# Altium footprint library WR-FPC_1.00mm.PcbLib: 105 footprints (part 6 of 7)
Each footprint in its own frame and in the unit in brackets; x right, y up, seen from the top. Pads: shape width x height; smd on the part's side, far side on the other; paste and mask are expansions set on the pad; w line width, h text height; cw(c..) or ccw(c..) is an arc to the next point about the centre after c.
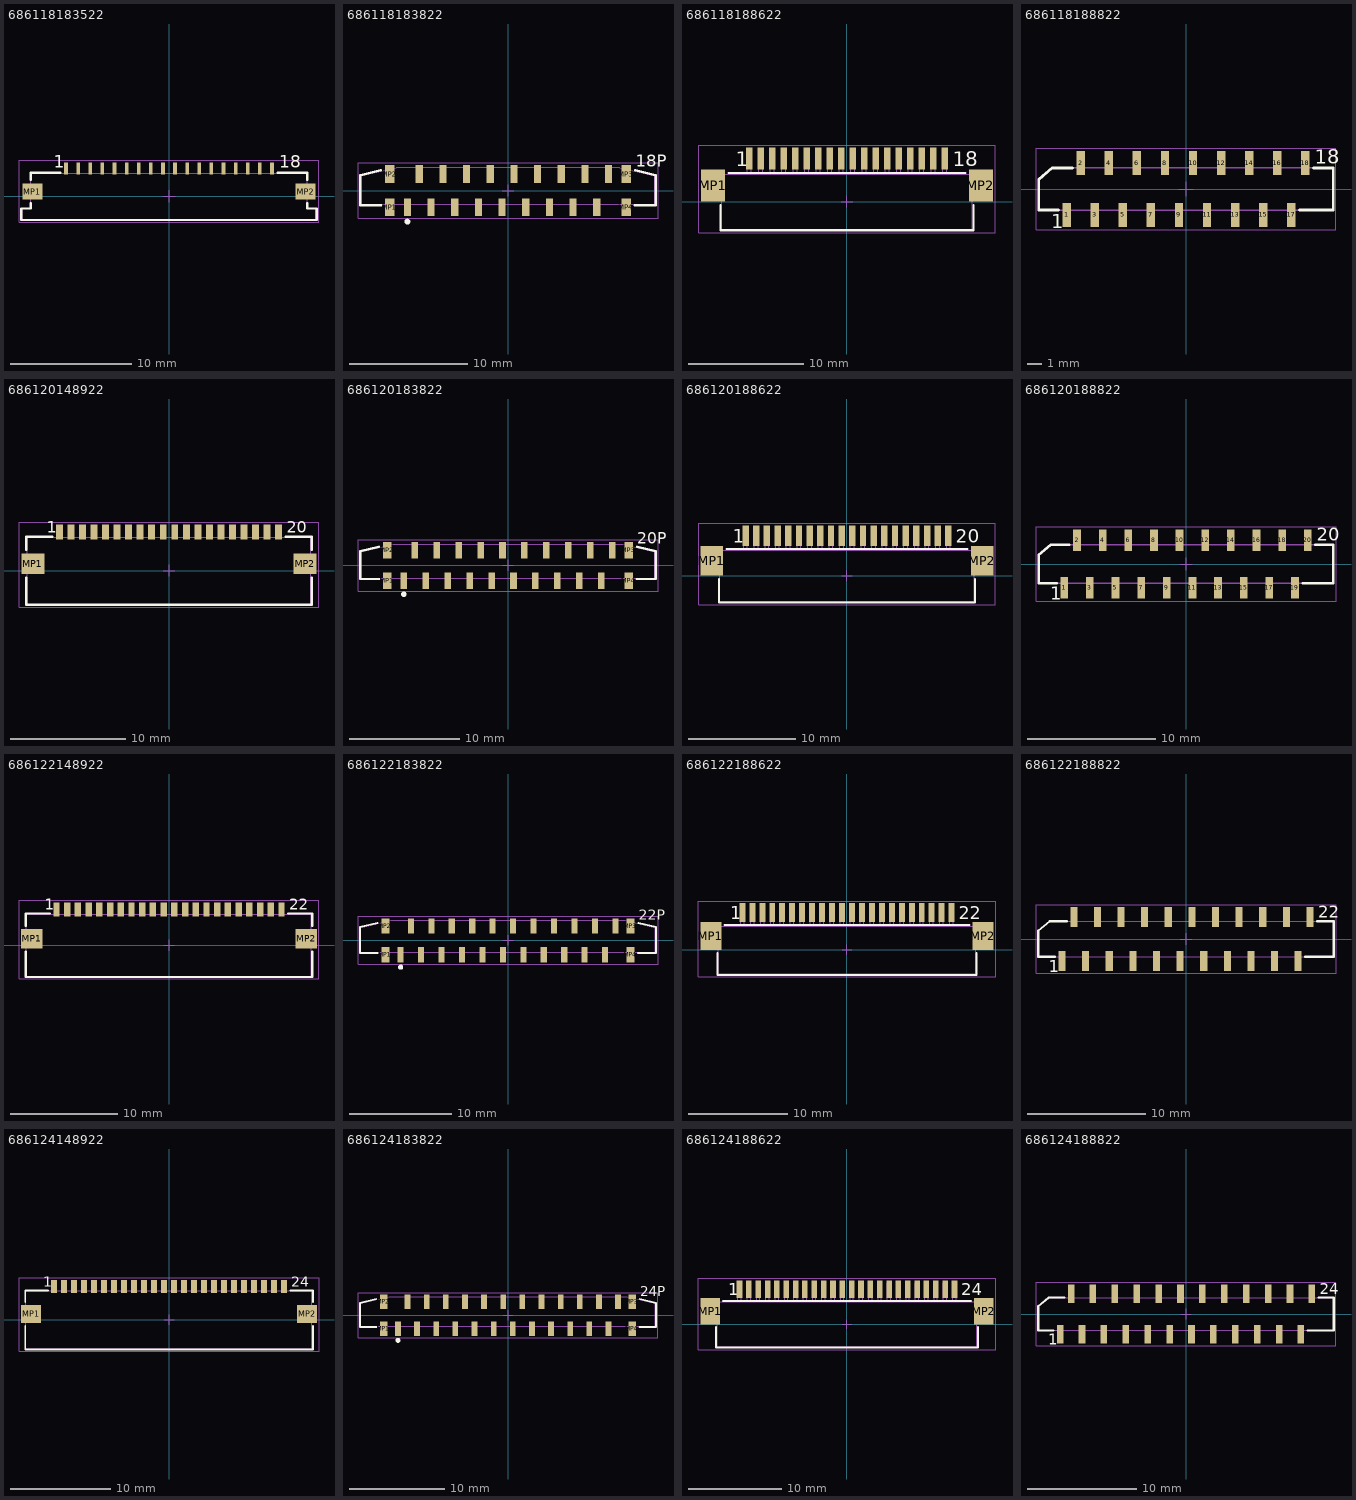
[diagram p5: the footprints below, top view; thin cyan lines are the x and y axes]

## 686118183522 [mm] "ZIF Connectors, Horizontal, Bottom Contact Low Profile, pitch 1mm, 18p"
height 1.3
pads (20):
  rect 0.3x1 smd: 1(-8.5,2.3) 2(-7.5,2.3) 3(-6.5,2.3) 4(-5.5,2.3) 5(-4.5,2.3) 6(-3.5,2.3) 7(-2.5,2.3) 8(-1.5,2.3) 9(-0.5,2.3) 10(0.5,2.3) 11(1.5,2.3) 12(2.5,2.3) 13(3.5,2.3) 14(4.5,2.3) 15(5.5,2.3) 16(6.5,2.3) 17(7.5,2.3) 18(8.5,2.3)
  rect 1.65x1.3 smd: MP1(-11.275,0.4) MP2(11.275,0.4)
Top Overlay:
  lines w0.2: -11.4,-0.55 -11.4,-1 -12.175,-1 -12.175,-1.95 12.175,-1.95 12.175,-1 11.4,-1 11.4,-0.55 ; -11.4,1.35 -11.4,1.95 -8.95,1.95 ; 8.95,1.95 11.4,1.95 11.4,1.35
  text "18" at 9.1,2.35 h1.02
  text "1" at -9.5,2.35 h1.02
Mechanical 13:
  lines w0.1: -12.1,-1 -11.4,-1 -11.4,1.9 11.4,1.9 11.4,-1 12.1,-1 12.1,-1.9 -12.1,-1.9 -12.1,-1 ; -12.1,-1 -12.1,-1
Mechanical 15:
  lines w0.05: -0.5,0 0.5,0 ; 0,-0.5 0,0.5 ; -12.375,-2.15 12.375,-2.15 12.375,3 -12.375,3 -12.375,-2.15
3D body "686118183522.stp": height 1.24, standoff -0.01, extent -12.1,-1.9 12.1,2.35

## 686118183822 [mm] "ZIF Connectors, Vertical, Type A, pitch 1mm, 18p"
height 4
pads (22):
  rect 0.6x1.5 smd: 1(-8.5,-1.4) 2(-7.5,1.4) 3(-6.5,-1.4) 4(-5.5,1.4) 5(-4.5,-1.4) 6(-3.5,1.4) 7(-2.5,-1.4) 8(-1.5,1.4) 9(-0.5,-1.4) 10(0.5,1.4) 11(1.5,-1.4) 12(2.5,1.4) 13(3.5,-1.4) 14(4.5,1.4) 15(5.5,-1.4) 16(6.5,1.4) 17(7.5,-1.4) 18(8.5,1.4)
  rect 0.8x1.5 smd: MP1(-10,-1.4) MP2(-10,1.4) MP3(10,1.4) MP4(10,-1.4)
Top Overlay:
  circle w0.25: c-8.5,-2.625 r0.125
  lines w0.2: -10.765,1.708 -12.475,1.297 -12.475,-1.225 -10.725,-1.225 ; 10.725,-1.225 12.475,-1.225 12.475,1.297 10.765,1.708
  text "18P" at 10.8,2 h1.02
Mechanical 13:
  lines w0.1: -12.4,-1.15 -12.4,1.24 -9.45,1.949 9.45,1.95 12.4,1.24 12.4,-1.15 -12.4,-1.15
Mechanical 15:
  lines w0.05: -0.5,0 0.5,0 ; 0,-0.5 0,0.5 ; -12.675,-2.35 -12.675,2.35 12.675,2.35 12.675,-2.35 -12.675,-2.35
3D body "686118183822.stp": height 4, standoff -0.02, extent -12.4,-1.65 12.4,1.95

## 686118188622 [mm] "LIF Connectors, Horizontal, Top Contact, pitch 1mm, 18p"
height 3.1
pads (20):
  rect 0.6x1.9 smd: 1(-8.5,3.75) 2(-7.5,3.75) 3(-6.5,3.75) 4(-5.5,3.75) 5(-4.5,3.75) 6(-3.5,3.75) 7(-2.5,3.75) 8(-1.5,3.75) 9(-0.5,3.75) 10(0.5,3.75) 11(1.5,3.75) 12(2.5,3.75) 13(3.5,3.75) 14(4.5,3.75) 15(5.5,3.75) 16(6.5,3.75) 17(7.5,3.75) 18(8.5,3.75)
  rect 2.1x2.8 smd: MP1(-11.65,1.4) MP2(11.65,1.4)
Top Overlay:
  lines w0.2: -11,-0.3 -11,-2.5 11,-2.5 11,-0.3 ; -10.3,2.5 10.3,2.5
  text "1" at -9.7,3.1 h1.27
  text "18" at 9.2,3.1 h1.27
Mechanical 13:
  lines w0.1: -8.675,2.4 -8.675,4.4 -8.325,4.4 -8.325,2.4 ; -7.675,2.4 -7.675,4.4 -7.325,4.4 -7.325,2.4 ; -6.675,2.4 -6.675,4.4 -6.325,4.4 -6.325,2.4 ; -5.675,2.4 -5.675,4.4 -5.325,4.4 -5.325,2.4 ; -4.675,2.4 -4.675,4.4 -4.325,4.4 -4.325,2.4 ; -3.675,2.4 -3.675,4.4 -3.325,4.4 -3.325,2.4 ; -2.675,2.4 -2.675,4.4 -2.325,4.4 -2.325,2.4 ; -1.675,2.4 -1.675,4.4 -1.325,4.4 -1.325,2.4 ; -0.675,2.4 -0.675,4.4 -0.325,4.4 -0.325,2.4 ; 0.325,2.4 0.325,4.4 0.675,4.4 0.675,2.4 ; 1.325,2.4 1.325,4.4 1.675,4.4 1.675,2.4 ; 2.325,2.4 2.325,4.4 2.675,4.4 2.675,2.4 ; 3.325,2.4 3.325,4.4 3.675,4.4 3.675,2.4 ; 4.325,2.4 4.325,4.4 4.675,4.4 4.675,2.4 ; 5.325,2.4 5.325,4.4 5.675,4.4 5.675,2.4 ; 6.325,2.4 6.325,4.4 6.675,4.4 6.675,2.4 ; 7.325,2.4 7.325,4.4 7.675,4.4 7.675,2.4 ; 8.325,2.4 8.325,4.4 8.675,4.4 8.675,2.4 ; -12.15,0.4 -12.15,2.4 12.15,2.4 12.15,0.4 10.9,0.4 10.9,-2.4 -10.9,-2.4 -10.9,0.4 -12.15,0.4
Mechanical 15:
  lines w0.05: -0.5,0 0.5,0 ; 0,-0.5 0,0.5 ; -12.9,-2.7 -12.9,4.9 12.9,4.9 12.9,-2.7 -12.9,-2.7
3D body "686118188622.stp": height 3.1, standoff -0.01, extent -12.15,-2.4 12.15,4.4

## 686118188822 [mm] "LIF Connectors, Vertical Type A,  pitch 1mm, 18p"
height 5.1
pads (18):
  rect 0.6x1.7 smd: 1(-8.5,-1.85) 2(-7.5,1.85) 3(-6.5,-1.85) 4(-5.5,1.85) 5(-4.5,-1.85) 6(-3.5,1.85) 7(-2.5,-1.85) 8(-1.5,1.85) 9(-0.5,-1.85) 10(0.5,1.85) 11(1.5,-1.85) 12(2.5,1.85) 13(3.5,-1.85) 14(4.5,1.85) 15(5.5,-1.85) 16(6.5,1.85) 17(7.5,-1.85) 18(8.5,1.85)
Top Overlay:
  lines w0.2: -9.1,-1.5 -10.5,-1.5 -10.5,0.7 -9.547,1.5 -8.1,1.5 ; 8.1,-1.5 10.5,-1.5 10.5,1.5 9.1,1.5
  text "1" at -9.6,-2.8 h1.02
  text "18" at 9.2,1.8 h1.02
Mechanical 13:
  lines w0.1: -8.675,-1.5 -8.675,-2.2 -8.325,-2.2 -8.325,-1.5 ; -7.675,1.5 -7.675,2.2 -7.325,2.2 -7.325,1.5 ; -6.675,-1.5 -6.675,-2.2 -6.325,-2.2 -6.325,-1.5 ; -5.675,1.5 -5.675,2.2 -5.325,2.2 -5.325,1.5 ; -4.675,-1.5 -4.675,-2.2 -4.325,-2.2 -4.325,-1.5 ; -3.675,1.5 -3.675,2.2 -3.325,2.2 -3.325,1.5 ; -2.675,-1.5 -2.675,-2.2 -2.325,-2.2 -2.325,-1.5 ; -1.675,1.5 -1.675,2.2 -1.325,2.2 -1.325,1.5 ; -0.675,-1.5 -0.675,-2.2 -0.325,-2.2 -0.325,-1.5 ; 0.325,1.5 0.325,2.2 0.675,2.2 0.675,1.5 ; 1.325,-1.5 1.325,-2.2 1.675,-2.2 1.675,-1.5 ; 2.325,1.5 2.325,2.2 2.675,2.2 2.675,1.5 ; 3.325,-1.5 3.325,-2.2 3.675,-2.2 3.675,-1.5 ; 4.325,1.5 4.325,2.2 4.675,2.2 4.675,1.5 ; 5.325,-1.5 5.325,-2.2 5.675,-2.2 5.675,-1.5 ; 6.325,1.5 6.325,2.2 6.675,2.2 6.675,1.5 ; 7.325,-1.5 7.325,-2.2 7.675,-2.2 7.675,-1.5 ; 8.325,1.5 8.325,2.2 8.675,2.2 8.675,1.5 ; -10.5,-1.5 -10.5,0.7 -9.547,1.5 10.5,1.5 10.5,-1.5 -10.5,-1.5
Mechanical 15:
  lines w0.05: -0.5,0 0.5,0 ; 0,-0.5 0,0.5 ; -10.7,-2.9 -10.7,2.9 10.7,2.9 10.7,-2.9 -10.7,-2.9
3D body "686118188822.stp": height 5.21, standoff 0.01, extent -10.5,-2.2 10.5,2.2

## 686120148922 [mm] "ZIF Connectors, Horizontal, Bottom Contact Hinge Type, pitch 1mm, 20p"
height 2.3
pads (22):
  rect 0.6x1.3 smd: 1(-9.5,3.35) 2(-8.5,3.35) 3(-7.5,3.35) 4(-6.5,3.35) 5(-5.5,3.35) 6(-4.5,3.35) 7(-3.5,3.35) 8(-2.5,3.35) 9(-1.5,3.35) 10(-0.5,3.35) 11(0.5,3.35) 12(1.5,3.35) 13(2.5,3.35) 14(3.5,3.35) 15(4.5,3.35) 16(5.5,3.35) 17(6.5,3.35) 18(7.5,3.35) 19(8.5,3.35) 20(9.5,3.35)
  rect 2x1.8 smd: MP1(-11.8,0.6) MP2(11.8,0.6)
Top Overlay:
  lines w0.2: -12.375,-0.6 -12.375,-2.95 12.375,-2.95 12.375,-0.6 ; -12.375,1.8 -12.375,2.95 -10.125,2.95 ; 10.125,2.95 12.375,2.95 12.375,1.8
  text "1" at -10.6,3.3 h1.02
  text "20" at 10.2,3.3 h1.02
Mechanical 13:
  lines w0.1: -12.3,-2.9 12.3,-2.9 12.3,2.9 -12.3,2.9 -12.3,-2.9
Mechanical 15:
  lines w0.05: -0.5,0 0.5,0 ; 0,-0.5 0,0.5 ; -13,-3.15 13,-3.15 13,4.2 -13,4.2 -13,-3.15
3D body "686120148922.stp": height 2.27, standoff 0.02, extent -12.3,-2.9 12.3,3.6

## 686120183822 [mm] "ZIF Connectors, Vertical, Type A, pitch 1mm, 20p"
height 4
pads (24):
  rect 0.6x1.5 smd: 1(-9.5,-1.4) 2(-8.5,1.4) 3(-7.5,-1.4) 4(-6.5,1.4) 5(-5.5,-1.4) 6(-4.5,1.4) 7(-3.5,-1.4) 8(-2.5,1.4) 9(-1.5,-1.4) 10(-0.5,1.4) 11(0.5,-1.4) 12(1.5,1.4) 13(2.5,-1.4) 14(3.5,1.4) 15(4.5,-1.4) 16(5.5,1.4) 17(6.5,-1.4) 18(7.5,1.4) 19(8.5,-1.4) 20(9.5,1.4)
  rect 0.8x1.5 smd: MP1(-11,-1.4) MP2(-11,1.4) MP3(11,1.4) MP4(11,-1.4)
Top Overlay:
  circle w0.25: c-9.5,-2.625 r0.125
  lines w0.2: -11.765,1.708 -13.475,1.297 -13.475,-1.225 -11.725,-1.225 ; 11.725,-1.225 13.475,-1.225 13.475,1.297 11.765,1.708
  text "20P" at 11.8,2 h1.02
Mechanical 13:
  lines w0.1: -13.4,-1.15 13.4,-1.15 13.4,1.24 10.45,1.949 -10.45,1.95 -13.4,1.24 -13.4,-1.15
Mechanical 15:
  lines w0.05: -0.5,0 0.5,0 ; 0,-0.5 0,0.5 ; -13.675,-2.35 13.675,-2.35 13.675,2.35 -13.675,2.35 -13.675,-2.35
3D body "686120183822.stp": height 4, standoff -0.02, extent -13.4,-1.65 13.4,1.95

## 686120188622 [mm] "LIF Connectors, Horizontal, Top Contact, pitch 1mm, 20p"
height 3.1
pads (22):
  rect 0.6x1.9 smd: 1(-9.5,3.75) 2(-8.5,3.75) 3(-7.5,3.75) 4(-6.5,3.75) 5(-5.5,3.75) 6(-4.5,3.75) 7(-3.5,3.75) 8(-2.5,3.75) 9(-1.5,3.75) 10(-0.5,3.75) 11(0.5,3.75) 12(1.5,3.75) 13(2.5,3.75) 14(3.5,3.75) 15(4.5,3.75) 16(5.5,3.75) 17(6.5,3.75) 18(7.5,3.75) 19(8.5,3.75) 20(9.5,3.75)
  rect 2.1x2.8 smd: MP1(-12.65,1.4) MP2(12.65,1.4)
Top Overlay:
  lines w0.2: -12,-0.3 -12,-2.5 12,-2.5 12,-0.3 ; -11.3,2.5 11.3,2.5
  text "1" at -10.7,3.1 h1.27
  text "20" at 10.2,3.1 h1.27
Mechanical 13:
  lines w0.1: -9.675,2.4 -9.675,4.4 -9.325,4.4 -9.325,2.4 ; -8.675,2.4 -8.675,4.4 -8.325,4.4 -8.325,2.4 ; -7.675,2.4 -7.675,4.4 -7.325,4.4 -7.325,2.4 ; -6.675,2.4 -6.675,4.4 -6.325,4.4 -6.325,2.4 ; -5.675,2.4 -5.675,4.4 -5.325,4.4 -5.325,2.4 ; -4.675,2.4 -4.675,4.4 -4.325,4.4 -4.325,2.4 ; -3.675,2.4 -3.675,4.4 -3.325,4.4 -3.325,2.4 ; -2.675,2.4 -2.675,4.4 -2.325,4.4 -2.325,2.4 ; -1.675,2.4 -1.675,4.4 -1.325,4.4 -1.325,2.4 ; -0.675,2.4 -0.675,4.4 -0.325,4.4 -0.325,2.4 ; 0.325,2.4 0.325,4.4 0.675,4.4 0.675,2.4 ; 1.325,2.4 1.325,4.4 1.675,4.4 1.675,2.4 ; 2.325,2.4 2.325,4.4 2.675,4.4 2.675,2.4 ; 3.325,2.4 3.325,4.4 3.675,4.4 3.675,2.4 ; 4.325,2.4 4.325,4.4 4.675,4.4 4.675,2.4 ; 5.325,2.4 5.325,4.4 5.675,4.4 5.675,2.4 ; 6.325,2.4 6.325,4.4 6.675,4.4 6.675,2.4 ; 7.325,2.4 7.325,4.4 7.675,4.4 7.675,2.4 ; 8.325,2.4 8.325,4.4 8.675,4.4 8.675,2.4 ; 9.325,2.4 9.325,4.4 9.675,4.4 9.675,2.4 ; -13.15,0.4 -11.9,0.4 -11.9,-2.4 11.9,-2.4 11.9,0.4 13.15,0.4 13.15,2.4 -13.15,2.4 -13.15,0.4
Mechanical 15:
  lines w0.05: -0.5,0 0.5,0 ; 0,-0.5 0,0.5 ; -13.9,-2.7 13.9,-2.7 13.9,4.9 -13.9,4.9 -13.9,-2.7
3D body "686120188622.stp": height 3.1, standoff -0.01, extent -13.15,-2.4 13.15,4.4

## 686120188822 [mm] "LIF Connectors, Vertical Type A,  pitch 1mm, 20p"
height 5.1
pads (20):
  rect 0.6x1.7 smd: 1(-9.5,-1.85) 2(-8.5,1.85) 3(-7.5,-1.85) 4(-6.5,1.85) 5(-5.5,-1.85) 6(-4.5,1.85) 7(-3.5,-1.85) 8(-2.5,1.85) 9(-1.5,-1.85) 10(-0.5,1.85) 11(0.5,-1.85) 12(1.5,1.85) 13(2.5,-1.85) 14(3.5,1.85) 15(4.5,-1.85) 16(5.5,1.85) 17(6.5,-1.85) 18(7.5,1.85) 19(8.5,-1.85) 20(9.5,1.85)
Top Overlay:
  lines w0.2: -10.1,-1.5 -11.5,-1.5 -11.5,0.7 -10.547,1.5 -9.1,1.5 ; 9.1,-1.5 11.5,-1.5 11.5,1.5 10.1,1.5
  text "1" at -10.6,-2.8 h1.02
  text "20" at 10.2,1.8 h1.02
Mechanical 13:
  lines w0.1: -9.675,-1.5 -9.675,-2.2 -9.325,-2.2 -9.325,-1.5 ; -8.675,1.5 -8.675,2.2 -8.325,2.2 -8.325,1.5 ; -7.675,-1.5 -7.675,-2.2 -7.325,-2.2 -7.325,-1.5 ; -6.675,1.5 -6.675,2.2 -6.325,2.2 -6.325,1.5 ; -5.675,-1.5 -5.675,-2.2 -5.325,-2.2 -5.325,-1.5 ; -4.675,1.5 -4.675,2.2 -4.325,2.2 -4.325,1.5 ; -3.675,-1.5 -3.675,-2.2 -3.325,-2.2 -3.325,-1.5 ; -2.675,1.5 -2.675,2.2 -2.325,2.2 -2.325,1.5 ; -1.675,-1.5 -1.675,-2.2 -1.325,-2.2 -1.325,-1.5 ; -0.675,1.5 -0.675,2.2 -0.325,2.2 -0.325,1.5 ; 0.325,-1.5 0.325,-2.2 0.675,-2.2 0.675,-1.5 ; 1.325,1.5 1.325,2.2 1.675,2.2 1.675,1.5 ; 2.325,-1.5 2.325,-2.2 2.675,-2.2 2.675,-1.5 ; 3.325,1.5 3.325,2.2 3.675,2.2 3.675,1.5 ; 4.325,-1.5 4.325,-2.2 4.675,-2.2 4.675,-1.5 ; 5.325,1.5 5.325,2.2 5.675,2.2 5.675,1.5 ; 6.325,-1.5 6.325,-2.2 6.675,-2.2 6.675,-1.5 ; 7.325,1.5 7.325,2.2 7.675,2.2 7.675,1.5 ; 8.325,-1.5 8.325,-2.2 8.675,-2.2 8.675,-1.5 ; 9.325,1.5 9.325,2.2 9.675,2.2 9.675,1.5 ; -11.5,-1.5 -11.5,0.7 -10.547,1.5 11.5,1.5 11.5,-1.5 -11.5,-1.5
Mechanical 15:
  lines w0.05: -0.5,0 0.5,0 ; 0,-0.5 0,0.5 ; -11.7,-2.9 -11.7,2.9 11.7,2.9 11.7,-2.9 -11.7,-2.9
3D body "686120188822.stp": height 5.21, standoff 0.01, extent -11.5,-2.2 11.5,2.2

## 686122148922 [mm] "ZIF Connectors, Horizontal, Bottom Contact Hinge Type, pitch 1mm, 22p"
height 2.3
pads (24):
  rect 0.6x1.3 smd: 1(-10.5,3.35) 2(-9.5,3.35) 3(-8.5,3.35) 4(-7.5,3.35) 5(-6.5,3.35) 6(-5.5,3.35) 7(-4.5,3.35) 8(-3.5,3.35) 9(-2.5,3.35) 10(-1.5,3.35) 11(-0.5,3.35) 12(0.5,3.35) 13(1.5,3.35) 14(2.5,3.35) 15(3.5,3.35) 16(4.5,3.35) 17(5.5,3.35) 18(6.5,3.35) 19(7.5,3.35) 20(8.5,3.35) 21(9.5,3.35) 22(10.5,3.35)
  rect 2x1.8 smd: MP1(-12.8,0.6) MP2(12.8,0.6)
Top Overlay:
  lines w0.2: -13.375,-0.6 -13.375,-2.95 13.375,-2.95 ; -13.375,1.8 -13.375,2.95 -11.125,2.95 ; 11.125,2.95 13.375,2.95 13.375,1.8 ; 13.375,-2.95 13.375,-0.6
  text "1" at -11.6,3.3 h1.02
  text "22" at 11.2,3.3 h1.02
Mechanical 13:
  lines w0.1: -13.3,-2.9 -13.3,2.9 13.3,2.9 13.3,-2.9 -13.3,-2.9
Mechanical 15:
  lines w0.05: -0.5,0 0.5,0 ; 0,-0.5 0,0.5 ; -14,-3.15 -14,4.2 14,4.2 14,-3.15 -14,-3.15
3D body "686122148922.stp": height 2.27, standoff 0.02, extent -13.3,-2.9 13.3,3.6

## 686122183822 [mm] "ZIF Connectors, Vertical, Type A, pitch 1mm, 22p"
height 4
pads (26):
  rect 0.6x1.5 smd: 1(-10.5,-1.4) 2(-9.5,1.4) 3(-8.5,-1.4) 4(-7.5,1.4) 5(-6.5,-1.4) 6(-5.5,1.4) 7(-4.5,-1.4) 8(-3.5,1.4) 9(-2.5,-1.4) 10(-1.5,1.4) 11(-0.5,-1.4) 12(0.5,1.4) 13(1.5,-1.4) 14(2.5,1.4) 15(3.5,-1.4) 16(4.5,1.4) 17(5.5,-1.4) 18(6.5,1.4) 19(7.5,-1.4) 20(8.5,1.4) 21(9.5,-1.4) 22(10.5,1.4)
  rect 0.8x1.5 smd: MP1(-12,-1.4) MP2(-12,1.4) MP3(12,1.4) MP4(12,-1.4)
Top Overlay:
  circle w0.25: c-10.5,-2.625 r0.125
  lines w0.2: -12.765,1.708 -14.475,1.297 -14.475,-1.225 -12.725,-1.225 ; 12.725,-1.225 14.475,-1.225 14.475,1.297 12.765,1.708
  text "22P" at 12.8,2 h1.02
Mechanical 13:
  lines w0.1: -14.4,-1.15 -14.4,1.24 -11.45,1.949 11.45,1.95 14.4,1.24 14.4,-1.15 -14.4,-1.15
Mechanical 15:
  lines w0.05: -0.5,0 0.5,0 ; 0,-0.5 0,0.5 ; -14.675,-2.35 -14.675,2.35 14.675,2.35 14.675,-2.35 -14.675,-2.35
3D body "686122183822.stp": height 4, standoff -0.02, extent -14.4,-1.65 14.4,1.95

## 686122188622 [mm] "LIF Connectors, Horizontal, Top Contact, pitch 1mm, 22p"
height 3.1
pads (24):
  rect 0.6x1.9 smd: 1(-10.5,3.75) 2(-9.5,3.75) 3(-8.5,3.75) 4(-7.5,3.75) 5(-6.5,3.75) 6(-5.5,3.75) 7(-4.5,3.75) 8(-3.5,3.75) 9(-2.5,3.75) 10(-1.5,3.75) 11(-0.5,3.75) 12(0.5,3.75) 13(1.5,3.75) 14(2.5,3.75) 15(3.5,3.75) 16(4.5,3.75) 17(5.5,3.75) 18(6.5,3.75) 19(7.5,3.75) 20(8.5,3.75) 21(9.5,3.75) 22(10.5,3.75)
  rect 2.1x2.8 smd: MP1(-13.65,1.4) MP2(13.65,1.4)
Top Overlay:
  lines w0.2: -13,-0.3 -13,-2.5 13,-2.5 13,-0.3 ; -12.3,2.5 12.3,2.5
  text "1" at -11.7,3.1 h1.27
  text "22" at 11.2,3.1 h1.27
Mechanical 13:
  lines w0.1: -10.675,2.4 -10.675,4.4 -10.325,4.4 -10.325,2.4 ; -9.675,2.4 -9.675,4.4 -9.325,4.4 -9.325,2.4 ; -8.675,2.4 -8.675,4.4 -8.325,4.4 -8.325,2.4 ; -7.675,2.4 -7.675,4.4 -7.325,4.4 -7.325,2.4 ; -6.675,2.4 -6.675,4.4 -6.325,4.4 -6.325,2.4 ; -5.675,2.4 -5.675,4.4 -5.325,4.4 -5.325,2.4 ; -4.675,2.4 -4.675,4.4 -4.325,4.4 -4.325,2.4 ; -3.675,2.4 -3.675,4.4 -3.325,4.4 -3.325,2.4 ; -2.675,2.4 -2.675,4.4 -2.325,4.4 -2.325,2.4 ; -1.675,2.4 -1.675,4.4 -1.325,4.4 -1.325,2.4 ; -0.675,2.4 -0.675,4.4 -0.325,4.4 -0.325,2.4 ; 0.325,2.4 0.325,4.4 0.675,4.4 0.675,2.4 ; 1.325,2.4 1.325,4.4 1.675,4.4 1.675,2.4 ; 2.325,2.4 2.325,4.4 2.675,4.4 2.675,2.4 ; 3.325,2.4 3.325,4.4 3.675,4.4 3.675,2.4 ; 4.325,2.4 4.325,4.4 4.675,4.4 4.675,2.4 ; 5.325,2.4 5.325,4.4 5.675,4.4 5.675,2.4 ; 6.325,2.4 6.325,4.4 6.675,4.4 6.675,2.4 ; 7.325,2.4 7.325,4.4 7.675,4.4 7.675,2.4 ; 8.325,2.4 8.325,4.4 8.675,4.4 8.675,2.4 ; 9.325,2.4 9.325,4.4 9.675,4.4 9.675,2.4 ; 10.325,2.4 10.325,4.4 10.675,4.4 10.675,2.4 ; -14.15,0.4 -12.9,0.4 -12.9,-2.4 12.9,-2.4 12.9,0.4 14.15,0.4 14.15,2.4 -14.15,2.4 -14.15,0.4
Mechanical 15:
  lines w0.05: -0.5,0 0.5,0 ; 0,-0.5 0,0.5 ; -14.9,-2.7 14.9,-2.7 14.9,4.9 -14.9,4.9 -14.9,-2.7
3D body "686122188622.stp": height 3.1, standoff -0.01, extent -14.15,-2.4 14.15,4.4

## 686122188822 [mm] "LIF Connectors, Vertical Type A,  pitch 1mm, 22p"
height 5.1
pads (22):
  rect 0.6x1.7 smd: 1(-10.5,-1.85) 2(-9.5,1.85) 3(-8.5,-1.85) 4(-7.5,1.85) 5(-6.5,-1.85) 6(-5.5,1.85) 7(-4.5,-1.85) 8(-3.5,1.85) 9(-2.5,-1.85) 10(-1.5,1.85) 11(-0.5,-1.85) 12(0.5,1.85) 13(1.5,-1.85) 14(2.5,1.85) 15(3.5,-1.85) 16(4.5,1.85) 17(5.5,-1.85) 18(6.5,1.85) 19(7.5,-1.85) 20(8.5,1.85) 21(9.5,-1.85) 22(10.5,1.85)
Top Overlay:
  lines w0.2: -11.1,-1.5 -12.5,-1.5 -12.5,0.7 -11.547,1.5 -10.1,1.5 ; 10.1,-1.5 12.5,-1.5 12.5,1.5 11.1,1.5
  text "1" at -11.6,-2.8 h1.02
  text "22" at 11.2,1.8 h1.02
Mechanical 13:
  lines w0.1: -10.675,-1.5 -10.675,-2.2 -10.325,-2.2 -10.325,-1.5 ; -9.675,1.5 -9.675,2.2 -9.325,2.2 -9.325,1.5 ; -8.675,-1.5 -8.675,-2.2 -8.325,-2.2 -8.325,-1.5 ; -7.675,1.5 -7.675,2.2 -7.325,2.2 -7.325,1.5 ; -6.675,-1.5 -6.675,-2.2 -6.325,-2.2 -6.325,-1.5 ; -5.675,1.5 -5.675,2.2 -5.325,2.2 -5.325,1.5 ; -4.675,-1.5 -4.675,-2.2 -4.325,-2.2 -4.325,-1.5 ; -3.675,1.5 -3.675,2.2 -3.325,2.2 -3.325,1.5 ; -2.675,-1.5 -2.675,-2.2 -2.325,-2.2 -2.325,-1.5 ; -1.675,1.5 -1.675,2.2 -1.325,2.2 -1.325,1.5 ; -0.675,-1.5 -0.675,-2.2 -0.325,-2.2 -0.325,-1.5 ; 0.325,1.5 0.325,2.2 0.675,2.2 0.675,1.5 ; 1.325,-1.5 1.325,-2.2 1.675,-2.2 1.675,-1.5 ; 2.325,1.5 2.325,2.2 2.675,2.2 2.675,1.5 ; 3.325,-1.5 3.325,-2.2 3.675,-2.2 3.675,-1.5 ; 4.325,1.5 4.325,2.2 4.675,2.2 4.675,1.5 ; 5.325,-1.5 5.325,-2.2 5.675,-2.2 5.675,-1.5 ; 6.325,1.5 6.325,2.2 6.675,2.2 6.675,1.5 ; 7.325,-1.5 7.325,-2.2 7.675,-2.2 7.675,-1.5 ; 8.325,1.5 8.325,2.2 8.675,2.2 8.675,1.5 ; 9.325,-1.5 9.325,-2.2 9.675,-2.2 9.675,-1.5 ; 10.325,1.5 10.325,2.2 10.675,2.2 10.675,1.5 ; -12.5,-1.5 12.5,-1.5 12.5,1.5 -11.547,1.5 -12.5,0.7 -12.5,-1.5
Mechanical 15:
  lines w0.05: -0.5,0 0.5,0 ; 0,-0.5 0,0.5 ; -12.7,-2.9 12.7,-2.9 12.7,2.9 -12.7,2.9 -12.7,-2.9
3D body "686122188822.stp": height 5.21, standoff 0.01, extent -12.5,-2.2 12.5,2.2

## 686124148922 [mm] "ZIF Connectors, Horizontal, Bottom Contact Hinge Type, pitch 1mm, 24p"
height 2.3
pads (26):
  rect 0.6x1.3 smd: 1(-11.5,3.35) 2(-10.5,3.35) 3(-9.5,3.35) 4(-8.5,3.35) 5(-7.5,3.35) 6(-6.5,3.35) 7(-5.5,3.35) 8(-4.5,3.35) 9(-3.5,3.35) 10(-2.5,3.35) 11(-1.5,3.35) 12(-0.5,3.35) 13(0.5,3.35) 14(1.5,3.35) 15(2.5,3.35) 16(3.5,3.35) 17(4.5,3.35) 18(5.5,3.35) 19(6.5,3.35) 20(7.5,3.35) 21(8.5,3.35) 22(9.5,3.35) 23(10.5,3.35) 24(11.5,3.35)
  rect 2x1.8 smd: MP1(-13.8,0.6) MP2(13.8,0.6)
Top Overlay:
  lines w0.2: -14.375,-0.6 -14.375,-2.95 14.375,-2.95 14.375,-0.6 ; -14.375,1.8 -14.375,2.95 -12.125,2.95 ; 12.125,2.95 14.375,2.95 14.375,1.8
  text "24" at 12.2,3.3 h1.02
  text "1" at -12.6,3.3 h1.02
Mechanical 13:
  lines w0.1: -14.3,-2.9 -14.3,2.9 14.3,2.9 14.3,-2.9 -14.3,-2.9
Mechanical 15:
  lines w0.05: -0.5,0 0.5,0 ; 0,-0.5 0,0.5 ; -15,-3.15 -15,4.2 15,4.2 15,-3.15 -15,-3.15
3D body "686124148922.stp": height 2.27, standoff 0.02, extent -14.3,-2.9 14.3,3.6

## 686124183822 [mm] "ZIF Connectors, Vertical, Type A, pitch 1mm, 24p"
height 4
pads (28):
  rect 0.6x1.5 smd: 1(-11.5,-1.4) 2(-10.5,1.4) 3(-9.5,-1.4) 4(-8.5,1.4) 5(-7.5,-1.4) 6(-6.5,1.4) 7(-5.5,-1.4) 8(-4.5,1.4) 9(-3.5,-1.4) 10(-2.5,1.4) 11(-1.5,-1.4) 12(-0.5,1.4) 13(0.5,-1.4) 14(1.5,1.4) 15(2.5,-1.4) 16(3.5,1.4) 17(4.5,-1.4) 18(5.5,1.4) 19(6.5,-1.4) 20(7.5,1.4) 21(8.5,-1.4) 22(9.5,1.4) 23(10.5,-1.4) 24(11.5,1.4)
  rect 0.8x1.5 smd: MP1(-13,-1.4) MP2(-13,1.4) MP3(13,1.4) MP4(13,-1.4)
Top Overlay:
  circle w0.25: c-11.5,-2.625 r0.125
  lines w0.2: -13.765,1.708 -15.475,1.297 -15.475,-1.225 -13.725,-1.225 ; 13.725,-1.225 15.475,-1.225 15.475,1.297 13.765,1.708
  text "24P" at 13.8,2 h1.02
Mechanical 13:
  lines w0.1: -15.4,-1.15 -15.4,1.24 -12.45,1.949 12.45,1.95 15.4,1.24 15.4,-1.15 -15.4,-1.15
Mechanical 15:
  lines w0.05: -0.5,0 0.5,0 ; 0,-0.5 0,0.5 ; -15.675,-2.35 -15.675,2.35 15.675,2.35 15.675,-2.35 -15.675,-2.35
3D body "686124183822.stp": height 4, standoff -0.02, extent -15.4,-1.65 15.4,1.95

## 686124188622 [mm] "LIF Connectors, Horizontal, Top Contact, pitch 1mm, 24p"
height 3.1
pads (26):
  rect 0.6x1.9 smd: 1(-11.5,3.75) 2(-10.5,3.75) 3(-9.5,3.75) 4(-8.5,3.75) 5(-7.5,3.75) 6(-6.5,3.75) 7(-5.5,3.75) 8(-4.5,3.75) 9(-3.5,3.75) 10(-2.5,3.75) 11(-1.5,3.75) 12(-0.5,3.75) 13(0.5,3.75) 14(1.5,3.75) 15(2.5,3.75) 16(3.5,3.75) 17(4.5,3.75) 18(5.5,3.75) 19(6.5,3.75) 20(7.5,3.75) 21(8.5,3.75) 22(9.5,3.75) 23(10.5,3.75) 24(11.5,3.75)
  rect 2.1x2.8 smd: MP1(-14.65,1.4) MP2(14.65,1.4)
Top Overlay:
  lines w0.2: -14,-0.3 -14,-2.5 14,-2.5 14,-0.3 ; -13.3,2.5 13.3,2.5
  text "1" at -12.7,3.1 h1.27
  text "24" at 12.2,3.1 h1.27
Mechanical 13:
  lines w0.1: -11.675,2.4 -11.675,4.4 -11.325,4.4 -11.325,2.4 ; -10.675,2.4 -10.675,4.4 -10.325,4.4 -10.325,2.4 ; -9.675,2.4 -9.675,4.4 -9.325,4.4 -9.325,2.4 ; -8.675,2.4 -8.675,4.4 -8.325,4.4 -8.325,2.4 ; -7.675,2.4 -7.675,4.4 -7.325,4.4 -7.325,2.4 ; -6.675,2.4 -6.675,4.4 -6.325,4.4 -6.325,2.4 ; -5.675,2.4 -5.675,4.4 -5.325,4.4 -5.325,2.4 ; -4.675,2.4 -4.675,4.4 -4.325,4.4 -4.325,2.4 ; -3.675,2.4 -3.675,4.4 -3.325,4.4 -3.325,2.4 ; -2.675,2.4 -2.675,4.4 -2.325,4.4 -2.325,2.4 ; -1.675,2.4 -1.675,4.4 -1.325,4.4 -1.325,2.4 ; -0.675,2.4 -0.675,4.4 -0.325,4.4 -0.325,2.4 ; 0.325,2.4 0.325,4.4 0.675,4.4 0.675,2.4 ; 1.325,2.4 1.325,4.4 1.675,4.4 1.675,2.4 ; 2.325,2.4 2.325,4.4 2.675,4.4 2.675,2.4 ; 3.325,2.4 3.325,4.4 3.675,4.4 3.675,2.4 ; 4.325,2.4 4.325,4.4 4.675,4.4 4.675,2.4 ; 5.325,2.4 5.325,4.4 5.675,4.4 5.675,2.4 ; 6.325,2.4 6.325,4.4 6.675,4.4 6.675,2.4 ; 7.325,2.4 7.325,4.4 7.675,4.4 7.675,2.4 ; 8.325,2.4 8.325,4.4 8.675,4.4 8.675,2.4 ; 9.325,2.4 9.325,4.4 9.675,4.4 9.675,2.4 ; 10.325,2.4 10.325,4.4 10.675,4.4 10.675,2.4 ; 11.325,2.4 11.325,4.4 11.675,4.4 11.675,2.4 ; -15.15,0.4 -13.9,0.4 -13.9,-2.4 13.9,-2.4 13.9,0.4 15.15,0.4 15.15,2.4 -15.15,2.4 -15.15,0.4
Mechanical 15:
  lines w0.05: -0.5,0 0.5,0 ; 0,-0.5 0,0.5 ; -15.9,-2.7 15.9,-2.7 15.9,4.9 -15.9,4.9 -15.9,-2.7
3D body "686124188622.stp": height 3.1, standoff -0.01, extent -15.15,-2.4 15.15,4.4

## 686124188822 [mm] "LIF Connectors, Vertical Type A,  pitch 1mm, 24p"
height 5.1
pads (24):
  rect 0.6x1.7 smd: 1(-11.5,-1.85) 2(-10.5,1.85) 3(-9.5,-1.85) 4(-8.5,1.85) 5(-7.5,-1.85) 6(-6.5,1.85) 7(-5.5,-1.85) 8(-4.5,1.85) 9(-3.5,-1.85) 10(-2.5,1.85) 11(-1.5,-1.85) 12(-0.5,1.85) 13(0.5,-1.85) 14(1.5,1.85) 15(2.5,-1.85) 16(3.5,1.85) 17(4.5,-1.85) 18(5.5,1.85) 19(6.5,-1.85) 20(7.5,1.85) 21(8.5,-1.85) 22(9.5,1.85) 23(10.5,-1.85) 24(11.5,1.85)
Top Overlay:
  lines w0.2: -12.1,-1.5 -13.5,-1.5 -13.5,0.7 -12.547,1.5 -11.1,1.5 ; 11.1,-1.5 13.5,-1.5 13.5,1.5 12.1,1.5
  text "1" at -12.6,-2.8 h1.02
  text "24" at 12.2,1.8 h1.02
Mechanical 13:
  lines w0.1: -12.547,1.5 13.5,1.5 13.5,-1.5 -13.5,-1.5 -13.5,0.7 -12.547,1.5 ; -11.675,-1.5 -11.675,-2.2 -11.325,-2.2 -11.325,-1.5 ; -10.675,1.5 -10.675,2.2 -10.325,2.2 -10.325,1.5 ; -9.675,-1.5 -9.675,-2.2 -9.325,-2.2 -9.325,-1.5 ; -8.675,1.5 -8.675,2.2 -8.325,2.2 -8.325,1.5 ; -7.675,-1.5 -7.675,-2.2 -7.325,-2.2 -7.325,-1.5 ; -6.675,1.5 -6.675,2.2 -6.325,2.2 -6.325,1.5 ; -5.675,-1.5 -5.675,-2.2 -5.325,-2.2 -5.325,-1.5 ; -4.675,1.5 -4.675,2.2 -4.325,2.2 -4.325,1.5 ; -3.675,-1.5 -3.675,-2.2 -3.325,-2.2 -3.325,-1.5 ; -2.675,1.5 -2.675,2.2 -2.325,2.2 -2.325,1.5 ; -1.675,-1.5 -1.675,-2.2 -1.325,-2.2 -1.325,-1.5 ; -0.675,1.5 -0.675,2.2 -0.325,2.2 -0.325,1.5 ; 0.325,-1.5 0.325,-2.2 0.675,-2.2 0.675,-1.5 ; 1.325,1.5 1.325,2.2 1.675,2.2 1.675,1.5 ; 2.325,-1.5 2.325,-2.2 2.675,-2.2 2.675,-1.5 ; 3.325,1.5 3.325,2.2 3.675,2.2 3.675,1.5 ; 4.325,-1.5 4.325,-2.2 4.675,-2.2 4.675,-1.5 ; 5.325,1.5 5.325,2.2 5.675,2.2 5.675,1.5 ; 6.325,-1.5 6.325,-2.2 6.675,-2.2 6.675,-1.5 ; 7.325,1.5 7.325,2.2 7.675,2.2 7.675,1.5 ; 8.325,-1.5 8.325,-2.2 8.675,-2.2 8.675,-1.5 ; 9.325,1.5 9.325,2.2 9.675,2.2 9.675,1.5 ; 10.325,-1.5 10.325,-2.2 10.675,-2.2 10.675,-1.5 ; 11.325,1.5 11.325,2.2 11.675,2.2 11.675,1.5
Mechanical 15:
  lines w0.05: -0.5,0 0.5,0 ; 0,-0.5 0,0.5 ; -13.7,-2.9 -13.7,2.9 13.7,2.9 13.7,-2.9 -13.7,-2.9
3D body "686124188822.stp": height 5.21, standoff 0.01, extent -13.5,-2.2 13.5,2.2